# Altium schematic symbol library Transistor.SchLib: 3457 symbols (part 12 of 27) (continued)
## MCH3474-TL-H
designator Q?
N-Channel Power MOSFET, 30 V, 4 A, 50 mOhm, 3-Pin MCPH, Pb-Free, Tape and Reel; Manufacturer: On Semiconductor; PartNumber: MCH3474-TL-H; Channel Polarity: N Channel; Ciss Typ (pF): 430; Configuration: Single; Coss Typ (pF): 59; Crss Typ (pF): 38; ID Max (A): 4; PD Max (W): 1; V(BR)DSS Min (V): 30; VGS Max (V): 12; VGS(th) Max (V): 1.3; PackageReference: MCPH-3; PackageDescription: 3-Pin Small Outline Transistor, Body 2 x 1.6 mm, Pitch 0.65 mm; Supplier 1: Digi-Key; Supplier Part Number 1: MCH3474-TL-H-ND; Supplier 2: Mouser; Supplier Part Number 2: 863-MCH3474-TL-H; Package Type: SC-70FL / MCPH-3; Packing: Tape and Reel; RoHS: Pb-Free; Mounting Technology: Surface Mount; ComponentLink1Description: Manufacturer URL; ComponentLink1URL: http://www.onsemi.com/; ComponentLink2Description: Datasheet; ComponentLink2URL: http://www.onsemi.com/PowerSolutions/product.do?id=MCH3474; ComponentLink3Description: Package Specification; ComponentLink3URL: http://www.onsemi.com/pub_link/Collateral/EN7354-D.PDF
footprint ONSC-MCPH-3_V (SOT23, 3-Leads, Body 2x1.6mm, Pitch 0.65mm)
pins: 1 G, 2 S, 3 D

## MCH3475-TL-E
designator Q?
N-Channel Power MOSFET, 30 V, 1.8 A, 180 mOhm, 3-Pin MCPH, Pb-Free, Tape and Reel; Manufacturer: On Semiconductor; PartNumber: MCH3475-TL-E; Channel Polarity: N Channel; Ciss Typ (pF): 88; Configuration: Single; Coss Typ (pF): 19; Crss Typ (pF): 11; ID Max (A): 1.8; PD Max (W): 0.8; V(BR)DSS Min (V): 30; VGS Max (V): 20; VGS(th) Max (V): 2.6; PackageReference: MCPH-3; PackageDescription: 3-Pin Small Outline Transistor, Body 2 x 1.6 mm, Pitch 0.65 mm; Supplier 1: Digi-Key; Supplier Part Number 1: 869-1172-2-ND; Supplier 2: Digi-Key; Supplier Part Number 2: 869-1172-1-ND; Supplier 3: Digi-Key; Supplier Part Number 3: 869-1172-6-ND; Supplier 4: Mouser; Supplier Part Number 4: 863-MCH3475-TL-E; Package Type: SC-70FL / MCPH-3; Packing: Tape and Reel; RoHS: Pb-Free; Mounting Technology: Surface Mount; ComponentLink1Description: Manufacturer URL; ComponentLink1URL: http://www.onsemi.com/; ComponentLink2Description: Datasheet; ComponentLink2URL: http://www.onsemi.cn/pub_link/Collateral/MCH3475-D.PDF; ComponentLink3Description: Package Specification; ComponentLink3URL: http://www.onsemi.com/pub_link/Collateral/EN7354-D.PDF
footprint ONSC-MCPH-3_V (SOT23, 3-Leads, Body 2x1.6mm, Pitch 0.65mm)
pins: 1 G, 2 S, 3 D

## MCH3476-TL-H
designator Q?
N-Channel Power MOSFET, 20 V, 2 A, 125 mOhm, 3-Pin MCPH, Pb-Free, Tape and Reel; Manufacturer: On Semiconductor; PartNumber: MCH3476-TL-H; Channel Polarity: N Channel; Ciss Typ (pF): 128; Configuration: Single; Coss Typ (pF): 28; Crss Typ (pF): 21; ID Max (A): 2; PD Max (W): 0.8; V(BR)DSS Min (V): 20; VGS Max (V): 12; VGS(th) Max (V): 1.3; PackageReference: MCPH-3; PackageDescription: 3-Pin Small Outline Transistor, Body 2 x 1.6 mm, Pitch 0.65 mm; Supplier 1: Digi-Key; Supplier Part Number 1: MCH3476-TL-H-ND; Supplier 2: Mouser; Supplier Part Number 2: 863-MCH3476-TL-H; Package Type: SC-70FL / MCPH-3; Packing: Tape and Reel; RoHS: Pb-Free; Mounting Technology: Surface Mount; ComponentLink1Description: Manufacturer URL; ComponentLink1URL: http://www.onsemi.com/; ComponentLink2Description: Datasheet; ComponentLink2URL: http://www.onsemi.cn/pub_link/Collateral/MCH3476.PDF; ComponentLink3Description: Package Specification; ComponentLink3URL: http://www.onsemi.com/pub_link/Collateral/EN7354-D.PDF
footprint ONSC-MCPH-3_V (SOT23, 3-Leads, Body 2x1.6mm, Pitch 0.65mm)
pins: 1 G, 2 S, 3 D

## MCH3477-TL-E
designator Q?
N-Channel Power MOSFET, 20 V, 4.5 A, 38 mOhm, 3-Pin MCPH, Pb-Free, Tape and Reel; Manufacturer: On Semiconductor; PartNumber: MCH3477-TL-E; Channel Polarity: N Channel; Ciss Typ (pF): 410; Configuration: Single; Coss Typ (pF): 84; Crss Typ (pF): 59; ID Max (A): 4.5; PD Max (W): 1; V(BR)DSS Min (V): 20; VGS Max (V): 12; VGS(th) Max (V): 1.3; PackageReference: MCPH-3; PackageDescription: 3-Pin Small Outline Transistor, Body 2 x 1.6 mm, Pitch 0.65 mm; Supplier 1: Digi-Key; Supplier Part Number 1: MCH3477-TL-E-ND; Supplier 2: Mouser; Supplier Part Number 2: 863-MCH3477-TL-E; Package Type: SC-70FL / MCPH-3; Packing: Tape and Reel; RoHS: Pb-Free; Mounting Technology: Surface Mount; ComponentLink1Description: Manufacturer URL; ComponentLink1URL: http://www.onsemi.com/; ComponentLink2Description: Datasheet; ComponentLink2URL: http://www.onsemi.com/pub_link/Collateral/MCH3477-D.PDF; ComponentLink3Description: Package Specification; ComponentLink3URL: http://www.onsemi.com/pub_link/Collateral/EN7354-D.PDF
footprint ONSC-MCPH-3_V (SOT23, 3-Leads, Body 2x1.6mm, Pitch 0.65mm)
pins: 1 G, 2 S, 3 D

## MCH3477-TL-H
designator Q?
N-Channel Power MOSFET, 20 V, 4.5 A, 38 mOhm, 3-Pin MCPH, Pb-Free, Tape and Reel; Manufacturer: On Semiconductor; PartNumber: MCH3477-TL-H; Channel Polarity: N Channel; Ciss Typ (pF): 410; Configuration: Single; Coss Typ (pF): 84; Crss Typ (pF): 59; ID Max (A): 4.5; PD Max (W): 1; V(BR)DSS Min (V): 20; VGS Max (V): 12; VGS(th) Max (V): 1.3; PackageReference: MCPH-3; PackageDescription: 3-Pin Small Outline Transistor, Body 2 x 1.6 mm, Pitch 0.65 mm; Supplier 1: Digi-Key; Supplier Part Number 1: MCH3477-TL-H-ND; Supplier 2: Mouser; Supplier Part Number 2: 863-MCH3477-TL-H; Package Type: SC-70FL / MCPH-3; Packing: Tape and Reel; RoHS: Pb-Free; Mounting Technology: Surface Mount; ComponentLink1Description: Manufacturer URL; ComponentLink1URL: http://www.onsemi.com/; ComponentLink2Description: Datasheet; ComponentLink2URL: http://www.onsemi.com/pub_link/Collateral/MCH3477-D.PDF; ComponentLink3Description: Package Specification; ComponentLink3URL: http://www.onsemi.com/pub_link/Collateral/EN7354-D.PDF
footprint ONSC-MCPH-3_V (SOT23, 3-Leads, Body 2x1.6mm, Pitch 0.65mm)
pins: 1 G, 2 S, 3 D

## MCH3478-TL-H
designator Q?
N-Channel Power MOSFET, 30 V, 2 A, 165 mOhm, 3-Pin MCPH, Pb-Free, Tape and Reel; Manufacturer: On Semiconductor; PartNumber: MCH3478-TL-H; Channel Polarity: N Channel; Ciss Typ (pF): 130; Configuration: Single; Coss Typ (pF): 21; Crss Typ (pF): 14; V(BR)DSS Min (V): 30; VGS Max (V): 12; VGS(th) Max (V): 1.3; PackageReference: MCPH-3; PackageDescription: 3-Pin Small Outline Transistor, Body 2 x 1.6 mm, Pitch 0.65 mm; Supplier 1: Digi-Key; Supplier Part Number 1: MCH3478-TL-H-ND; Supplier 2: Mouser; Supplier Part Number 2: 863-MCH3478-TL-H; Package Type: SC-70FL / MCPH-3; Packing: Tape and Reel; RoHS: Pb-Free; Mounting Technology: Surface Mount; ComponentLink1Description: Manufacturer URL; ComponentLink1URL: http://www.onsemi.com/; ComponentLink2Description: Datasheet; ComponentLink2URL: http://www.onsemi.cn/pub_link/Collateral/ENAA1353-D.PDF; ComponentLink3Description: Package Specification; ComponentLink3URL: http://www.onsemi.com/pub_link/Collateral/EN7354-D.PDF
footprint ONSC-MCPH-3_V (SOT23, 3-Leads, Body 2x1.6mm, Pitch 0.65mm)
pins: 1 G, 2 S, 3 D

## MCH3479-TL-H
designator Q?
N-Channel Power MOSFET, 20 V, 3.5 A, 64 mOhm, 3-Pin MCPH, Pb-Free, Tape and Reel; Manufacturer: On Semiconductor; PartNumber: MCH3479-TL-H; Channel Polarity: N Channel; Ciss Typ (pF): 260; Configuration: Single; Coss Typ (pF): 65; Crss Typ (pF): 50; ID Max (A): 3.5; PD Max (W): 0.9; V(BR)DSS Min (V): 20; VGS Max (V): 12; VGS(th) Max (V): 1.3; PackageReference: MCPH-3; PackageDescription: 3-Pin Small Outline Transistor, Body 2 x 1.6 mm, Pitch 0.65 mm; Supplier 1: Digi-Key; Supplier Part Number 1: MCH3479-TL-H-ND; Supplier 2: Mouser; Supplier Part Number 2: 863-MCH3479-TL-H; Package Type: SC-70FL / MCPH-3; Packing: Tape and Reel; RoHS: Pb-Free; Mounting Technology: Surface Mount; ComponentLink1Description: Manufacturer URL; ComponentLink1URL: http://www.onsemi.com/; ComponentLink2Description: Datasheet; ComponentLink2URL: http://www.onsemi.cn/pub_link/Collateral/ENA1813-D.PDF; ComponentLink3Description: Package Specification; ComponentLink3URL: http://www.onsemi.com/pub_link/Collateral/EN7354-D.PDF
footprint ONSC-MCPH-3_V (SOT23, 3-Leads, Body 2x1.6mm, Pitch 0.65mm)
pins: 1 G, 2 S, 3 D

## MCH3481-TL-H
designator Q?
N-Channel Power MOSFET, 20 V, 2 A, 104 mOhm, 3-Pin MCPH, Pb-Free, Tape and Reel; Manufacturer: On Semiconductor; PartNumber: MCH3481-TL-H; Channel Polarity: N Channel; Ciss Typ (pF): 175; Configuration: Single; Coss Typ (pF): 30; Crss Typ (pF): 25; ID Max (A): 2; PD Max (W): 0.8; V(BR)DSS Min (V): 20; VGS Max (V): 9; VGS(th) Max (V): 0.9; PackageReference: MCPH-3; PackageDescription: 3-Pin Small Outline Transistor, Body 2 x 1.6 mm, Pitch 0.65 mm; Supplier 1: Digi-Key; Supplier Part Number 1: MCH3481-TL-H-ND; Supplier 2: Newark; Supplier Part Number 2: 07W7072; Supplier 3: Mouser; Supplier Part Number 3: 863-MCH3481-TL-H; Package Type: SC-70FL / MCPH-3; Packing: Tape and Reel; RoHS: Pb-Free; Mounting Technology: Surface Mount; ComponentLink1Description: Manufacturer URL; ComponentLink1URL: http://www.onsemi.com/; ComponentLink2Description: Datasheet; ComponentLink2URL: http://www.onsemi.com/pub_link/Collateral/ENA1767-D.PDF; ComponentLink3Description: Package Specification; ComponentLink3URL: http://www.onsemi.com/pub_link/Collateral/EN7354-D.PDF
footprint ONSC-MCPH-3_V (SOT23, 3-Leads, Body 2x1.6mm, Pitch 0.65mm)
pins: 1 G, 2 S, 3 D

## MCH3484-TL-H
designator Q?
N-Channel Power MOSFET, 20 V, 4.5 A, 40 mOhm, 3-Pin MCPH, Pb-Free, Tape and Reel; Manufacturer: On Semiconductor; PartNumber: MCH3484-TL-H; Channel Polarity: N Channel; Ciss Typ (pF): 630; Configuration: Single; Coss Typ (pF): 75; Crss Typ (pF): 65; ID Max (A): 4.5; PD Max (W): 1; V(BR)DSS Min (V): 20; VGS Max (V): 5; VGS(th) Max (V): 0.8; PackageReference: MCPH-3; PackageDescription: 3-Pin Small Outline Transistor, Body 2 x 1.6 mm, Pitch 0.65 mm; Supplier 1: Digi-Key; Supplier Part Number 1: MCH3484-TL-H-ND; Supplier 2: Mouser; Supplier Part Number 2: 863-MCH3484-TL-H; Package Type: SC-70FL / MCPH-3; Packing: Tape and Reel; RoHS: Pb-Free; Mounting Technology: Surface Mount; ComponentLink1Description: Manufacturer URL; ComponentLink1URL: http://www.onsemi.com/; ComponentLink2Description: Datasheet; ComponentLink2URL: http://www.onsemi.cn/pub_link/Collateral/ENA1883-D.PDF; ComponentLink3Description: Package Specification; ComponentLink3URL: http://www.onsemi.com/pub_link/Collateral/EN7354-D.PDF
footprint ONSC-MCPH-3_V (SOT23, 3-Leads, Body 2x1.6mm, Pitch 0.65mm)
pins: 1 G, 2 S, 3 D

## MCH3486-TL-H
designator Q?
N-Channel Power MOSFET, 60 V, 2 A, 137 mOhm, 3-Pin MCPH, Pb-Free, Tape and Reel; Manufacturer: On Semiconductor; PartNumber: MCH3486-TL-H; Channel Polarity: N Channel; Ciss Typ (pF): 310; Configuration: Single; Coss Typ (pF): 40; Crss Typ (pF): 25; ID Max (A): 2; PD Max (W): 1; V(BR)DSS Min (V): 60; VGS Max (V): 20; VGS(th) Max (V): 2.6; PackageReference: MCPH-3; PackageDescription: 3-Pin Small Outline Transistor, Body 2 x 1.6 mm, Pitch 0.65 mm; Supplier 1: Newark; Supplier Part Number 1: 97W6144; Supplier 2: Mouser; Supplier Part Number 2: 863-MCH3486-TL-H; Package Type: SC-70FL / MCPH-3; Packing: Tape and Reel; RoHS: Pb-Free; Mounting Technology: Surface Mount; ComponentLink1Description: Manufacturer URL; ComponentLink1URL: http://www.onsemi.com/; ComponentLink2Description: Datasheet; ComponentLink2URL: http://www.onsemi.com/pub_link/Collateral/ENA2188-D.PDF; ComponentLink3Description: Package Specification; ComponentLink3URL: http://www.onsemi.com/pub_link/Collateral/EN7354-D.PDF
footprint ONSC-MCPH-3_V (SOT23, 3-Leads, Body 2x1.6mm, Pitch 0.65mm)
pins: 1 G, 2 S, 3 D

## MCH4014-TL-H
designator Q?
RF Transistor, 12 V, 30 mA, fT=10 GHz, NPN Single, 4-Pin MCPH, Pb-Free, Tape and Reel; Manufacturer: On Semiconductor; PartNumber: MCH4014-TL-H; fT Min (MHz): 8000; IC Continuous (A): 0.03; PackageReference: MCPH-4; PackageDescription: 4-Pin Small Outline Transistor, Body 2 x 1.6 mm, Pitch 0.65 mm; Supplier 1: Digi-Key; Supplier Part Number 1: MCH4014-TL-H-ND; Supplier 2: Mouser; Supplier Part Number 2: 863-MCH4014-TL-H; Packing: Tape and Reel; Polarity: NPN; RoHS: TRUE; Mounting Technology: Surface Mount; ComponentLink1Description: Manufacturer URL; ComponentLink1URL: http://www.onsemi.com/; ComponentLink2Description: Datasheet; ComponentLink2URL: http://www.onsemi.com/pub_link/Collateral/MCH4014-D.PDF; ComponentLink3Description: Package Specification; ComponentLink3URL: http://www.onsemi.com/pub_link/Collateral/ENA0389-D.PDF
footprint ONSC-MCPH-4_V (SOT23, 4-Leads, Body 2x1.6mm, Pitch 0.65mm)
pins: 1 C, 2 E, 3 B, 4 E
text: 2, 4

## MCH4015-TL-H
designator Q?
RF Transistor, 12 V, 100 mA, fT=10 GHz, NPN Single, 4-Pin MCPH, Pb-Free, Tape and Reel; Manufacturer: On Semiconductor; PartNumber: MCH4015-TL-H; fT Min (MHz): 8000; IC Continuous (A): 0.1; PackageReference: MCPH-4; PackageDescription: 4-Pin Small Outline Transistor, Body 2 x 1.6 mm, Pitch 0.65 mm; Supplier 1: Digi-Key; Supplier Part Number 1: MCH4015-TL-H-ND; Supplier 2: Mouser; Supplier Part Number 2: 863-MCH4015-TL-H; Packing: Tape and Reel; Polarity: NPN; RoHS: TRUE; Mounting Technology: Surface Mount; ComponentLink1Description: Manufacturer URL; ComponentLink1URL: http://www.onsemi.com/; ComponentLink2Description: Datasheet; ComponentLink2URL: http://www.onsemi.com/pub_link/Collateral/MCH4015-D.PDF; ComponentLink3Description: Package Specification; ComponentLink3URL: http://www.onsemi.com/pub_link/Collateral/ENA0389-D.PDF
footprint ONSC-MCPH-4_V (SOT23, 4-Leads, Body 2x1.6mm, Pitch 0.65mm)
pins: 1 C, 2 E, 3 B, 4 E
text: 2, 4

## MCH4016-TL-H
designator Q?
RF Transistor, 12 V, 30 mA, fT=10 GHz, NPN Single, 4-Pin MCPH, Pb-Free, Tape and Reel; Manufacturer: On Semiconductor; PartNumber: MCH4016-TL-H; fT Min (MHz): 8000; IC Continuous (A): 0.03; PackageReference: MCPH-4; PackageDescription: 4-Pin Small Outline Transistor, Body 2 x 1.6 mm, Pitch 0.65 mm; Supplier 1: Digi-Key; Supplier Part Number 1: MCH4016-TL-H-ND; Supplier 2: Mouser; Supplier Part Number 2: 863-MCH4016-TL-H; Packing: Tape and Reel; Polarity: NPN; RoHS: TRUE; Mounting Technology: Surface Mount; ComponentLink1Description: Manufacturer URL; ComponentLink1URL: http://www.onsemi.com/; ComponentLink2Description: Datasheet; ComponentLink2URL: http://www.onsemi.com/pub_link/Collateral/MCH4016-D.PDF; ComponentLink3Description: Package Specification; ComponentLink3URL: http://www.onsemi.com/pub_link/Collateral/ENA0389-D.PDF
footprint ONSC-MCPH-4_V (SOT23, 4-Leads, Body 2x1.6mm, Pitch 0.65mm)
pins: 1 E, 2 C, 3 E, 4 B
text: 1, 3

## MCH4017-TL-H
designator Q?
RF Transistor, 12 V, 100 mA, fT=10 GHz, NPN Single, 4-Pin MCPH, Pb-Free, Tape and Reel; Manufacturer: On Semiconductor; PartNumber: MCH4017-TL-H; fT Min (MHz): 8000; IC Continuous (A): 0.1; PackageReference: MCPH-4; PackageDescription: 4-Pin Small Outline Transistor, Body 2 x 1.6 mm, Pitch 0.65 mm; Supplier 1: Digi-Key; Supplier Part Number 1: MCH4017-TL-H-ND; Supplier 2: Mouser; Supplier Part Number 2: 863-MCH4017-TL-H; Packing: Tape and Reel; Polarity: NPN; RoHS: TRUE; Mounting Technology: Surface Mount; ComponentLink1Description: Manufacturer URL; ComponentLink1URL: http://www.onsemi.com/; ComponentLink2Description: Datasheet; ComponentLink2URL: http://www.onsemi.com/pub_link/Collateral/MCH4017-D.PDF; ComponentLink3Description: Package Specification; ComponentLink3URL: http://www.onsemi.com/pub_link/Collateral/ENA0389-D.PDF
footprint ONSC-MCPH-4_V (SOT23, 4-Leads, Body 2x1.6mm, Pitch 0.65mm)
pins: 1 E, 2 C, 3 E, 4 B
text: 1, 3

## MCH4021-TL-E
designator Q?
RF Transistor, 8 V, 150 mA, fT=16 GHz, NPN Single, 4-Pin MCPH, Pb-Free, Tape and Reel; Manufacturer: On Semiconductor; PartNumber: MCH4021-TL-E; fT Min (MHz): 13000; IC Continuous (A): 0.15; PackageReference: MCPH-4; PackageDescription: 4-Pin Small Outline Transistor, Body 2 x 1.6 mm, Pitch 0.65 mm; Supplier 1: Digi-Key; Supplier Part Number 1: MCH4021-TL-E-ND; Supplier 2: Mouser; Supplier Part Number 2: 863-MCH4021-TL-E; Packing: Tape and Reel; Polarity: NPN; RoHS: TRUE; Mounting Technology: Surface Mount; ComponentLink1Description: Manufacturer URL; ComponentLink1URL: http://www.onsemi.com/; ComponentLink2Description: Datasheet; ComponentLink2URL: http://www.onsemi.com/pub_link/Collateral/MCH4021-D.PDF; ComponentLink3Description: Package Specification; ComponentLink3URL: http://www.onsemi.com/pub_link/Collateral/ENA0389-D.PDF
footprint ONSC-MCPH-4_V (SOT23, 4-Leads, Body 2x1.6mm, Pitch 0.65mm)
pins: 1 E, 2 C, 3 E, 4 B
text: 1, 3

## MCH5839-TL-H
designator U?
P-Channel Power MOSFET, -20 V, -1.5 A, 266 mOhm, 5-Pin MCPH, Pb-Free, Tape and Reel; Manufacturer: On Semiconductor; PartNumber: MCH5839-TL-H; Channel Polarity: P Channel; Ciss Typ (pF): 120; Configuration: with Schottky Diode; Coss Typ (pF): 26; Crss Typ (pF): 20; ID Max (A): 1.5; PD Max (W): 0.8; VGS Max (V): 10; VGS(th) Max (V): 1.4; PackageReference: MCPH-5; PackageDescription: 5-Pin Small Outline Transistor, Body 2 x 1.6 mm, Pitch 0.65 mm; Supplier 1: Newark; Supplier Part Number 1: 97W6145; Supplier 2: Mouser; Supplier Part Number 2: 863-MCH5839-TL-H; Package Type: SC-88AFL / MCPH-5; Packing: Tape and Reel; RoHS: Pb-Free; V(BR)DSS Min (V): 20; Mounting Technology: Surface Mount; ComponentLink1Description: Manufacturer URL; ComponentLink1URL: http://www.onsemi.com/; ComponentLink2Description: Datasheet; ComponentLink2URL: http://www.onsemi.cn/pub_link/Collateral/ENA2165-D.PDF; ComponentLink3Description: Package Specification; ComponentLink3URL: http://www.onsemi.com/pub_link/Collateral/ENA1218-D.PDF
footprint ONSC-MCPH-5_V (SOT23, 5-Leads, Body 2x1.6mm, Pitch 0.65mm)
part A pins: 1 G, 2 S, 5 D
part B pins: 3 A, 4 K

## MCH6320-TL-E
designator Q?
P-Channel Power MOSFET, -12 V, -3.5 A, 70 mOhm, Single, 6-Pin MCPH, Pb-Free, Tape and Reel; Manufacturer: On Semiconductor; PartNumber: MCH6320-TL-E; Channel Polarity: P Channel; Ciss Typ (pF): 405; Coss Typ (pF): 145; Crss Typ (pF): 100; ID Max (A): 3.5; PD Max (W): 1.5; V(BR)DSS Min (V): 12; VGS Max (V): 10; VGS(th) Max (V): 1.4; PackageReference: MCPH-6; PackageDescription: 6-Pin Small Outline Transistor, Body 2 x 1.6 mm, Pitch 0.65 mm; Supplier 1: Digi-Key; Supplier Part Number 1: MCH6320-TL-E-ND; Supplier 2: Mouser; Supplier Part Number 2: 863-MCH6320-TL-E; Configuration: Single; Package Type: SC-88FL / MCPH-6; Packing: Tape and Reel; RoHS: Pb-Free; Mounting Technology: Surface Mount; ComponentLink1Description: Manufacturer URL; ComponentLink1URL: http://www.onsemi.com/; ComponentLink2Description: Datasheet; ComponentLink2URL: http://www.onsemi.cn/pub_link/Collateral/MCH6320-D.PDF; ComponentLink3Description: Package Specification; ComponentLink3URL: http://www.onsemi.com/pub_link/Collateral/ENA1601-D.PDF
footprint ONSC-MCPH-6_V (SOT23, 6-Leads, Body 2x1.6mm, Pitch 0.65mm)
pins: 1 D, 2 D, 3 G, 4 S, 5 D, 6 D
text: 1, 2, 5, 6

## MCH6321-TL-E
designator Q?
P-Channel Power MOSFET, -20 V, -4 A, 83 mOhm, Single, 6-Pin MCPH, Pb-Free, Tape and Reel; Manufacturer: On Semiconductor; PartNumber: MCH6321-TL-E; Channel Polarity: P Channel; Ciss Typ (pF): 375; Coss Typ (pF): 77; Crss Typ (pF): 58; ID Max (A): 4; PD Max (W): 1.5; V(BR)DSS Min (V): 20; VGS Max (V): 10; VGS(th) Max (V): 1.3; PackageReference: MCPH-6; PackageDescription: 6-Pin Small Outline Transistor, Body 2 x 1.6 mm, Pitch 0.65 mm; Supplier 1: Digi-Key; Supplier Part Number 1: MCH6321-TL-E-ND; Supplier 2: Mouser; Supplier Part Number 2: 863-MCH6321-TL-E; Configuration: Single; Package Type: SC-88FL / MCPH-6; Packing: Tape and Reel; RoHS: Pb-Free; Mounting Technology: Surface Mount; ComponentLink1Description: Manufacturer URL; ComponentLink1URL: http://www.onsemi.com/; ComponentLink2Description: Datasheet; ComponentLink2URL: http://www.onsemi.cn/pub_link/Collateral/MCH6321-D.PDF; ComponentLink3Description: Package Specification; ComponentLink3URL: http://www.onsemi.com/pub_link/Collateral/ENA1601-D.PDF
footprint ONSC-MCPH-6_V (SOT23, 6-Leads, Body 2x1.6mm, Pitch 0.65mm)
pins: 1 D, 2 D, 3 G, 4 S, 5 D, 6 D
text: 1, 2, 5, 6

## MCH6331-TL-H
designator Q?
P-Channel Power MOSFET, -30 V, -3.5 A, 98 mOhm, Single, 6-Pin MCPH, Pb-Free, Tape and Reel; Manufacturer: On Semiconductor; PartNumber: MCH6331-TL-H; Channel Polarity: P Channel; Ciss Typ (pF): 250; Coss Typ (pF): 65; Crss Typ (pF): 46; ID Max (A): 3.5; PD Max (W): 1.5; V(BR)DSS Min (V): 30; VGS Max (V): 20; VGS(th) Max (V): 2.6; PackageReference: MCPH-6; PackageDescription: 6-Pin Small Outline Transistor, Body 2 x 1.6 mm, Pitch 0.65 mm; Supplier 1: Digi-Key; Supplier Part Number 1: MCH6331-TL-H-ND; Supplier 2: Mouser; Supplier Part Number 2: 863-MCH6331-TL-H; Configuration: Single; Package Type: SC-88FL / MCPH-6; Packing: Tape and Reel; RoHS: Pb-Free; Mounting Technology: Surface Mount; ComponentLink1Description: Manufacturer URL; ComponentLink1URL: http://www.onsemi.com/; ComponentLink2Description: Datasheet; ComponentLink2URL: http://www.onsemi.cn/pub_link/Collateral/MCH6331-D.PDF; ComponentLink3Description: Package Specification; ComponentLink3URL: http://www.onsemi.com/pub_link/Collateral/ENA1601-D.PDF
footprint ONSC-MCPH-6_V (SOT23, 6-Leads, Body 2x1.6mm, Pitch 0.65mm)
pins: 1 D, 2 D, 3 G, 4 S, 5 D, 6 D
text: 1, 2, 5, 6

## MCH6336-TL-E
designator Q?
P-Channel Power MOSFET, -12 V, -5 A, 43 mOhm, Single, 6-Pin MCPH, Pb-Free, Tape and Reel; Manufacturer: On Semiconductor; PartNumber: MCH6336-TL-E; Channel Polarity: P Channel; Ciss Typ (pF): 660; Coss Typ (pF): 210; Crss Typ (pF): 155; ID Max (A): 5; PD Max (W): 1.5; V(BR)DSS Min (V): 12; VGS Max (V): 10; VGS(th) Max (V): 1.4; PackageReference: MCPH-6; PackageDescription: 6-Pin Small Outline Transistor, Body 2 x 1.6 mm, Pitch 0.65 mm; Supplier 1: Newark; Supplier Part Number 1: 45W8491; Supplier 2: Mouser; Supplier Part Number 2: 863-MCH6336-TL-E; Configuration: Single; Package Type: SC-88FL / MCPH-6; Packing: Tape and Reel; RoHS: Pb-Free; Mounting Technology: Surface Mount; ComponentLink1Description: Manufacturer URL; ComponentLink1URL: http://www.onsemi.com/; ComponentLink2Description: Datasheet; ComponentLink2URL: http://www.onsemi.cn/pub_link/Collateral/MCH6336-D.PDF; ComponentLink3Description: Package Specification; ComponentLink3URL: http://www.onsemi.com/pub_link/Collateral/ENA1601-D.PDF
footprint ONSC-MCPH-6_V (SOT23, 6-Leads, Body 2x1.6mm, Pitch 0.65mm)
pins: 1 D, 2 D, 3 G, 4 S, 5 D, 6 D
text: 1, 2, 5, 6

## MCH6336-TL-H
designator Q?
P-Channel Power MOSFET, -12 V, -5 A, 43 mOhm, Single, 6-Pin MCPH, Pb-Free, Tape and Reel; Manufacturer: On Semiconductor; PartNumber: MCH6336-TL-H; Channel Polarity: P Channel; Ciss Typ (pF): 660; Coss Typ (pF): 210; Crss Typ (pF): 155; ID Max (A): 5; PD Max (W): 1.5; V(BR)DSS Min (V): 12; VGS Max (V): 10; VGS(th) Max (V): 1.4; PackageReference: MCPH-6; PackageDescription: 6-Pin Small Outline Transistor, Body 2 x 1.6 mm, Pitch 0.65 mm; Supplier 1: Digi-Key; Supplier Part Number 1: MCH6336-TL-H-ND; Supplier 2: Mouser; Supplier Part Number 2: 863-MCH6336-TL-H; Configuration: Single; Package Type: SC-88FL / MCPH-6; Packing: Tape and Reel; RoHS: Pb-Free; Mounting Technology: Surface Mount; ComponentLink1Description: Manufacturer URL; ComponentLink1URL: http://www.onsemi.com/; ComponentLink2Description: Datasheet; ComponentLink2URL: http://www.onsemi.cn/pub_link/Collateral/MCH6336-D.PDF; ComponentLink3Description: Package Specification; ComponentLink3URL: http://www.onsemi.com/pub_link/Collateral/ENA1601-D.PDF
footprint ONSC-MCPH-6_V (SOT23, 6-Leads, Body 2x1.6mm, Pitch 0.65mm)
pins: 1 D, 2 D, 3 G, 4 S, 5 D, 6 D
text: 1, 2, 5, 6

## MCH6337-TL-E
designator Q?
P-Channel Power MOSFET, -20 V, -4.5 A, 49 mOhm, Single, 6-Pin MCPH, Pb-Free, Tape and Reel; Manufacturer: On Semiconductor; PartNumber: MCH6337-TL-E; Channel Polarity: P Channel; Ciss Typ (pF): 670; Coss Typ (pF): 130; Crss Typ (pF): 94; ID Max (A): 4.5; PD Max (W): 1.5; V(BR)DSS Min (V): 20; VGS Max (V): 10; VGS(th) Max (V): 1.3; PackageReference: MCPH-6; PackageDescription: 6-Pin Small Outline Transistor, Body 2 x 1.6 mm, Pitch 0.65 mm; Supplier 1: Digi-Key; Supplier Part Number 1: 869-1177-2-ND; Supplier 2: Digi-Key; Supplier Part Number 2: 869-1177-1-ND; Supplier 3: Digi-Key; Supplier Part Number 3: 869-1177-6-ND; Supplier 4: Newark; Supplier Part Number 4: 45W8492; Supplier 5: Mouser; Supplier Part Number 5: 863-MCH6337-TL-E; Configuration: Single; Package Type: SC-88FL / MCPH-6; Packing: Tape and Reel; RoHS: Pb-Free; Mounting Technology: Surface Mount; ComponentLink1Description: Manufacturer URL; ComponentLink1URL: http://www.onsemi.com/; ComponentLink2Description: Datasheet; ComponentLink2URL: http://www.onsemi.cn/pub_link/Collateral/MCH6337-D.PDF; ComponentLink3Description: Package Specification; ComponentLink3URL: http://www.onsemi.com/pub_link/Collateral/ENA1601-D.PDF
footprint ONSC-MCPH-6_V (SOT23, 6-Leads, Body 2x1.6mm, Pitch 0.65mm)
pins: 1 D, 2 D, 3 G, 4 S, 5 D, 6 D
text: 1, 2, 5, 6

## MCH6337-TL-H
designator Q?
P-Channel Power MOSFET, -20 V, -4.5 A, 49 mOhm, Single, 6-Pin MCPH, Pb-Free, Tape and Reel; Manufacturer: On Semiconductor; PartNumber: MCH6337-TL-H; Channel Polarity: P Channel; Ciss Typ (pF): 670; Coss Typ (pF): 130; Crss Typ (pF): 94; ID Max (A): 4.5; PD Max (W): 1.5; V(BR)DSS Min (V): 20; VGS Max (V): 10; VGS(th) Max (V): 1.3; PackageReference: MCPH-6; PackageDescription: 6-Pin Small Outline Transistor, Body 2 x 1.6 mm, Pitch 0.65 mm; Supplier 1: Digi-Key; Supplier Part Number 1: MCH6337-TL-H-ND; Supplier 2: Mouser; Supplier Part Number 2: 863-MCH6337-TL-H; Configuration: Single; Package Type: SC-88FL / MCPH-6; Packing: Tape and Reel; RoHS: Pb-Free; Mounting Technology: Surface Mount; ComponentLink1Description: Manufacturer URL; ComponentLink1URL: http://www.onsemi.com/; ComponentLink2Description: Datasheet; ComponentLink2URL: http://www.onsemi.cn/pub_link/Collateral/MCH6337-D.PDF; ComponentLink3Description: Package Specification; ComponentLink3URL: http://www.onsemi.com/pub_link/Collateral/ENA1601-D.PDF
footprint ONSC-MCPH-6_V (SOT23, 6-Leads, Body 2x1.6mm, Pitch 0.65mm)
pins: 1 D, 2 D, 3 G, 4 S, 5 D, 6 D
text: 1, 2, 5, 6

## MCH6341-TL-E
designator Q?
P-Channel Power MOSFET, -30 V, -5 A, 59 mOhm, Single, 6-Pin MCPH, Pb-Free, Tape and Reel; Manufacturer: On Semiconductor; PartNumber: MCH6341-TL-E; Channel Polarity: P Channel; Ciss Typ (pF): 430; Coss Typ (pF): 105; Crss Typ (pF): 75; ID Max (A): 5; PD Max (W): 1.5; V(BR)DSS Min (V): 30; VGS Max (V): 20; VGS(th) Max (V): 2.6; PackageReference: MCPH-6; PackageDescription: 6-Pin Small Outline Transistor, Body 2 x 1.6 mm, Pitch 0.65 mm; Supplier 1: Digi-Key; Supplier Part Number 1: MCH6341-TL-E-ND; Supplier 2: Mouser; Supplier Part Number 2: 863-MCH6341-TL-E; Configuration: Single; Package Type: SC-88FL / MCPH-6; Packing: Tape and Reel; RoHS: Pb-Free; Mounting Technology: Surface Mount; ComponentLink1Description: Manufacturer URL; ComponentLink1URL: http://www.onsemi.com/; ComponentLink2Description: Datasheet; ComponentLink2URL: http://www.onsemi.cn/pub_link/Collateral/MCH6341-D.PDF; ComponentLink3Description: Package Specification; ComponentLink3URL: http://www.onsemi.com/pub_link/Collateral/ENA1601-D.PDF
footprint ONSC-MCPH-6_V (SOT23, 6-Leads, Body 2x1.6mm, Pitch 0.65mm)
pins: 1 D, 2 D, 3 G, 4 S, 5 D, 6 D
text: 1, 2, 5, 6

## MCH6341-TL-H
designator Q?
P-Channel Power MOSFET, -30 V, -5 A, 59 mOhm, Single, 6-Pin MCPH, Pb-Free, Tape and Reel; Manufacturer: On Semiconductor; PartNumber: MCH6341-TL-H; Channel Polarity: P Channel; Ciss Typ (pF): 430; Coss Typ (pF): 105; Crss Typ (pF): 75; ID Max (A): 5; PD Max (W): 1.5; V(BR)DSS Min (V): 30; VGS Max (V): 20; VGS(th) Max (V): 2.6; PackageReference: MCPH-6; PackageDescription: 6-Pin Small Outline Transistor, Body 2 x 1.6 mm, Pitch 0.65 mm; Supplier 1: Digi-Key; Supplier Part Number 1: MCH6341-TL-H-ND; Supplier 2: Mouser; Supplier Part Number 2: 863-MCH6341-TL-H; Configuration: Single; Package Type: SC-88FL / MCPH-6; Packing: Tape and Reel; RoHS: Pb-Free; Mounting Technology: Surface Mount; ComponentLink1Description: Manufacturer URL; ComponentLink1URL: http://www.onsemi.com/; ComponentLink2Description: Datasheet; ComponentLink2URL: http://www.onsemi.cn/pub_link/Collateral/MCH6341-D.PDF; ComponentLink3Description: Package Specification; ComponentLink3URL: http://www.onsemi.com/pub_link/Collateral/ENA1601-D.PDF
footprint ONSC-MCPH-6_V (SOT23, 6-Leads, Body 2x1.6mm, Pitch 0.65mm)
pins: 1 D, 2 D, 3 G, 4 S, 5 D, 6 D
text: 1, 2, 5, 6

## MCH6342-TL-H
designator Q?
P-Channel Power MOSFET, -30 V, -4.5 A, 73 mOhm, Single, 6-Pin MCPH, Pb-Free, Tape and Reel; Manufacturer: On Semiconductor; PartNumber: MCH6342-TL-H; Channel Polarity: P Channel; Ciss Typ (pF): 650; Coss Typ (pF): 105; Crss Typ (pF): 83; ID Max (A): 4.5; PD Max (W): 1.5; V(BR)DSS Min (V): 30; VGS Max (V): 10; VGS(th) Max (V): 1.3; PackageReference: MCPH-6; PackageDescription: 6-Pin Small Outline Transistor, Body 2 x 1.6 mm, Pitch 0.65 mm; Supplier 1: Digi-Key; Supplier Part Number 1: MCH6342-TL-H-ND; Supplier 2: Mouser; Supplier Part Number 2: 863-MCH6342-TL-H; Configuration: Single; Package Type: SC-88FL / MCPH-6; Packing: Tape and Reel; RoHS: Pb-Free; Mounting Technology: Surface Mount; ComponentLink1Description: Manufacturer URL; ComponentLink1URL: http://www.onsemi.com/; ComponentLink2Description: Datasheet; ComponentLink2URL: http://www.onsemi.cn/pub_link/Collateral/ENA1553-D.PDF; ComponentLink3Description: Package Specification; ComponentLink3URL: http://www.onsemi.com/pub_link/Collateral/ENA1601-D.PDF
footprint ONSC-MCPH-6_V (SOT23, 6-Leads, Body 2x1.6mm, Pitch 0.65mm)
pins: 1 D, 2 D, 3 G, 4 S, 5 D, 6 D
text: 1, 2, 5, 6

## MCH6344-TL-H
designator Q?
P-Channel Power MOSFET, -30 V, -2 A, 150 mOhm, Single, 6-Pin MCPH, Pb-Free, Tape and Reel; Manufacturer: On Semiconductor; PartNumber: MCH6344-TL-H; Channel Polarity: P Channel; Ciss Typ (pF): 172; Coss Typ (pF): 51; Crss Typ (pF): 36; ID Max (A): 2; PD Max (W): 0.8; V(BR)DSS Min (V): 30; VGS Max (V): 20; VGS(th) Max (V): 2.6; PackageReference: MCPH-6; PackageDescription: 6-Pin Small Outline Transistor, Body 2 x 1.6 mm, Pitch 0.65 mm; Supplier 1: Digi-Key; Supplier Part Number 1: MCH6344-TL-H-ND; Supplier 2: Mouser; Supplier Part Number 2: 863-MCH6344-TL-H; Configuration: Single; Package Type: SC-88FL / MCPH-6; Packing: Tape and Reel; RoHS: Pb-Free; Mounting Technology: Surface Mount; ComponentLink1Description: Manufacturer URL; ComponentLink1URL: http://www.onsemi.com/; ComponentLink2Description: Datasheet; ComponentLink2URL: http://www.onsemi.cn/pub_link/Collateral/EN8934-D.PDF; ComponentLink3Description: Package Specification; ComponentLink3URL: http://www.onsemi.com/pub_link/Collateral/ENA1601-D.PDF
footprint ONSC-MCPH-6_V (SOT23, 6-Leads, Body 2x1.6mm, Pitch 0.65mm)
pins: 1 D, 2 D, 3 G, 4 S, 5 D, 6 D
text: 1, 2, 5, 6

## MCH6351-TL-W
designator Q?
P-Channel Power MOSFET -12 V, -9 A, 16.9 mOhm, Single, 6-Pin MCPH, Pb-Free, Tape and Reel; Manufacturer: On Semiconductor; PartNumber: MCH6351-TL-W; Channel Polarity: P Channel; Ciss Typ (pF): 2200; Coss Typ (pF): 350; Crss Typ (pF): 320; ID Max (A): 9; PD Max (W): 1.5; V(BR)DSS Min (V): 12; VGS Max (V): 10; VGS(th) Max (V): 1.3; PackageReference: MCPH-6; PackageDescription: 6-Pin Small Outline Transistor, Body 2 x 1.6 mm, Pitch 0.65 mm; Supplier 1: Newark; Supplier Part Number 1: 97W6146; Supplier 2: Mouser; Supplier Part Number 2: 863-MCH6351-TL-W; Configuration: Single; Package Type: SC-88FL / MCPH-6; Packing: Tape and Reel; RoHS: Pb-Free; Mounting Technology: Surface Mount; ComponentLink1Description: Manufacturer URL; ComponentLink1URL: http://www.onsemi.com/; ComponentLink2Description: Datasheet; ComponentLink2URL: http://www.onsemi.com/pub_link/Collateral/ENA2198-D.PDF; ComponentLink3Description: Package Specification; ComponentLink3URL: http://www.onsemi.com/pub_link/Collateral/ENA1601-D.PDF
footprint ONSC-MCPH-6_V (SOT23, 6-Leads, Body 2x1.6mm, Pitch 0.65mm)
pins: 1 D, 2 D, 3 G, 4 S, 5 D, 6 D
text: 1, 2, 5, 6

## MCH6353-TL-W
designator Q?
P-Channel Power MOSFET, -12 V, -6.0 A, 35 mOhm, Single, 6-Pin MCPH, Pb-Free, Tape and Reel; Manufacturer: On Semiconductor; PartNumber: MCH6353-TL-W; Channel Polarity: P Channel; Ciss Typ (pF): 1250; Coss Typ (pF): 160; Crss Typ (pF): 150; ID Max (A): 6; PD Max (W): 1.4; V(BR)DSS Min (V): 12; VGS Max (V): 10; PackageReference: MCPH-6; PackageDescription: 6-Pin Small Outline Transistor, Body 2 x 1.6 mm, Pitch 0.65 mm; Supplier 1: Newark; Supplier Part Number 1: 11X3289; Supplier 2: Mouser; Supplier Part Number 2: 863-MCH6353-TL-W; Configuration: Single; Package Type: SC-88FL / MCPH-6; Packing: Tape and Reel; RoHS: Pb-Free; VGS(th) Max (V): 1.4; Mounting Technology: Surface Mount; ComponentLink1Description: Manufacturer URL; ComponentLink1URL: http://www.onsemi.com/; ComponentLink2Description: Datasheet; ComponentLink2URL: http://www.onsemi.com/pub_link/Collateral/ENA2206-D.PDF; ComponentLink3Description: Package Specification; ComponentLink3URL: http://www.onsemi.com/pub_link/Collateral/ENA1601-D.PDF
footprint ONSC-MCPH-6_V (SOT23, 6-Leads, Body 2x1.6mm, Pitch 0.65mm)
pins: 1 D, 2 D, 3 G, 4 S, 5 D, 6 D
text: 1, 2, 5, 6

## MCH6421-TL-E
designator Q?
N-Channel Power MOSFET, 20 V, 5.5 A, 38 mOhm, Single, 6-Pin MCPH, Pb-Free, Tape and Reel; Manufacturer: On Semiconductor; PartNumber: MCH6421-TL-E; Channel Polarity: N Channel; Ciss Typ (pF): 410; Coss Typ (pF): 84; Crss Typ (pF): 59; ID Max (A): 5.5; PD Max (W): 1.5; V(BR)DSS Min (V): 20; VGS Max (V): 12; VGS(th) Max (V): 1.3; PackageReference: MCPH-6; PackageDescription: 6-Pin Small Outline Transistor, Body 2 x 1.6 mm, Pitch 0.65 mm; Supplier 1: Digi-Key; Supplier Part Number 1: MCH6421-TL-E-ND; Supplier 2: Newark; Supplier Part Number 2: 65T1382; Supplier 3: Mouser; Supplier Part Number 3: 863-MCH6421-TL-E; Configuration: Single; Package Type: SC-88FL / MCPH-6; Packing: Tape and Reel; RoHS: Pb-Free; Mounting Technology: Surface Mount; ComponentLink1Description: Manufacturer URL; ComponentLink1URL: http://www.onsemi.com/; ComponentLink2Description: Datasheet; ComponentLink2URL: http://www.onsemi.cn/pub_link/Collateral/MCH6421-D.PDF; ComponentLink3Description: Package Specification; ComponentLink3URL: http://www.onsemi.com/pub_link/Collateral/ENA1601-D.PDF
footprint ONSC-MCPH-6_V (SOT23, 6-Leads, Body 2x1.6mm, Pitch 0.65mm)
pins: 1 D, 2 D, 3 G, 4 S, 5 D, 6 D
text: 1, 2, 5, 6

## MCH6431-TL-H
designator Q?
N-Channel Power MOSFET, 30 V, 5 A, 55 mOhm, Single, 6-Pin MCPH, Pb-Free, Tape and Reel; Manufacturer: On Semiconductor; PartNumber: MCH6431-TL-H; Channel Polarity: N Channel; Ciss Typ (pF): 280; Coss Typ (pF): 60; Crss Typ (pF): 30; ID Max (A): 5; PD Max (W): 1.5; VGS Max (V): 20; VGS(th) Max (V): 2.6; PackageReference: MCPH-6; PackageDescription: 6-Pin Small Outline Transistor, Body 2 x 1.6 mm, Pitch 0.65 mm; Supplier 1: Digi-Key; Supplier Part Number 1: MCH6431-TL-H-ND; Supplier 2: Newark; Supplier Part Number 2: 52T8103; Supplier 3: Mouser; Supplier Part Number 3: 863-MCH6431-TL-H; Configuration: Single; Package Type: SC-88FL / MCPH-6; Packing: Tape and Reel; RoHS: Pb-Free; V(BR)DSS Min (V): 30; Mounting Technology: Surface Mount; ComponentLink1Description: Manufacturer URL; ComponentLink1URL: http://www.onsemi.com/; ComponentLink2Description: Datasheet; ComponentLink2URL: http://www.onsemi.cn/pub_link/Collateral/MCH6431-D.PDF; ComponentLink3Description: Package Specification; ComponentLink3URL: http://www.onsemi.com/pub_link/Collateral/ENA1601-D.PDF
footprint ONSC-MCPH-6_V (SOT23, 6-Leads, Body 2x1.6mm, Pitch 0.65mm)
pins: 1 D, 2 D, 3 G, 4 S, 5 D, 6 D
text: 1, 2, 5, 6

## MCH6436-TL-E
designator Q?
N-Channel Power MOSFET, 30 V, 6 A, 34 mOhm, Single, 6-Pin MCPH, Pb-Free, Tape and Reel; Manufacturer: On Semiconductor; PartNumber: MCH6436-TL-E; Channel Polarity: N Channel; Ciss Typ (pF): 710; Coss Typ (pF): 95; Crss Typ (pF): 65; ID Max (A): 6; PD Max (W): 1.5; V(BR)DSS Min (V): 30; VGS Max (V): 12; VGS(th) Max (V): 1.3; PackageReference: MCPH-6; PackageDescription: 6-Pin Small Outline Transistor, Body 2 x 1.6 mm, Pitch 0.65 mm; Supplier 1: Digi-Key; Supplier Part Number 1: MCH6436-TL-E-ND; Supplier 2: Newark; Supplier Part Number 2: 52T8104; Supplier 3: Mouser; Supplier Part Number 3: 863-MCH6436-TL-E; Configuration: Single; Package Type: SC-88FL / MCPH-6; Packing: Tape and Reel; RoHS: Pb-Free; Mounting Technology: Surface Mount; ComponentLink1Description: Manufacturer URL; ComponentLink1URL: http://www.onsemi.com/; ComponentLink2Description: Datasheet; ComponentLink2URL: http://www.onsemi.cn/pub_link/Collateral/MCH6436-D.PDF; ComponentLink3Description: Package Specification; ComponentLink3URL: http://www.onsemi.com/pub_link/Collateral/ENA1601-D.PDF
footprint ONSC-MCPH-6_V (SOT23, 6-Leads, Body 2x1.6mm, Pitch 0.65mm)
pins: 1 D, 2 D, 3 G, 4 S, 5 D, 6 D
text: 1, 2, 5, 6

## MCH6437-TL-E
designator Q?
N-Channel Power MOSFET, 20 V, 7 A, 24 mOhm, Single, 6-Pin MCPH, Pb-Free, Tape and Reel; Manufacturer: On Semiconductor; PartNumber: MCH6437-TL-E; Channel Polarity: N Channel; Ciss Typ (pF): 660; Coss Typ (pF): 125; Crss Typ (pF): 100; ID Max (A): 7; PD Max (W): 1.5; V(BR)DSS Min (V): 20; VGS Max (V): 12; VGS(th) Max (V): 1.3; PackageReference: MCPH-6; PackageDescription: 6-Pin Small Outline Transistor, Body 2 x 1.6 mm, Pitch 0.65 mm; Supplier 1: Digi-Key; Supplier Part Number 1: MCH6437-TL-E-ND; Supplier 2: Mouser; Supplier Part Number 2: 863-MCH6437-TL-E; Configuration: Single; Package Type: SC-88FL / MCPH-6; Packing: Tape and Reel; RoHS: Pb-Free; Mounting Technology: Surface Mount; ComponentLink1Description: Manufacturer URL; ComponentLink1URL: http://www.onsemi.com/; ComponentLink2Description: Datasheet; ComponentLink2URL: http://www.onsemi.cn/pub_link/Collateral/MCH6437-D.PDF; ComponentLink3Description: Package Specification; ComponentLink3URL: http://www.onsemi.com/pub_link/Collateral/ENA1601-D.PDF
footprint ONSC-MCPH-6_V (SOT23, 6-Leads, Body 2x1.6mm, Pitch 0.65mm)
pins: 1 D, 2 D, 3 G, 4 S, 5 D, 6 D
